# Altium footprint library MYLIB.PcbLib: 600 footprints (part 38 of 39)
Each footprint in its own frame and in the unit in brackets; x right, y up, seen from the top. Pads: shape width x height; smd on the part's side, far side on the other; paste and mask are expansions set on the pad; w line width, h text height; cw(c..) or ccw(c..) is an arc to the next point about the centre after c.
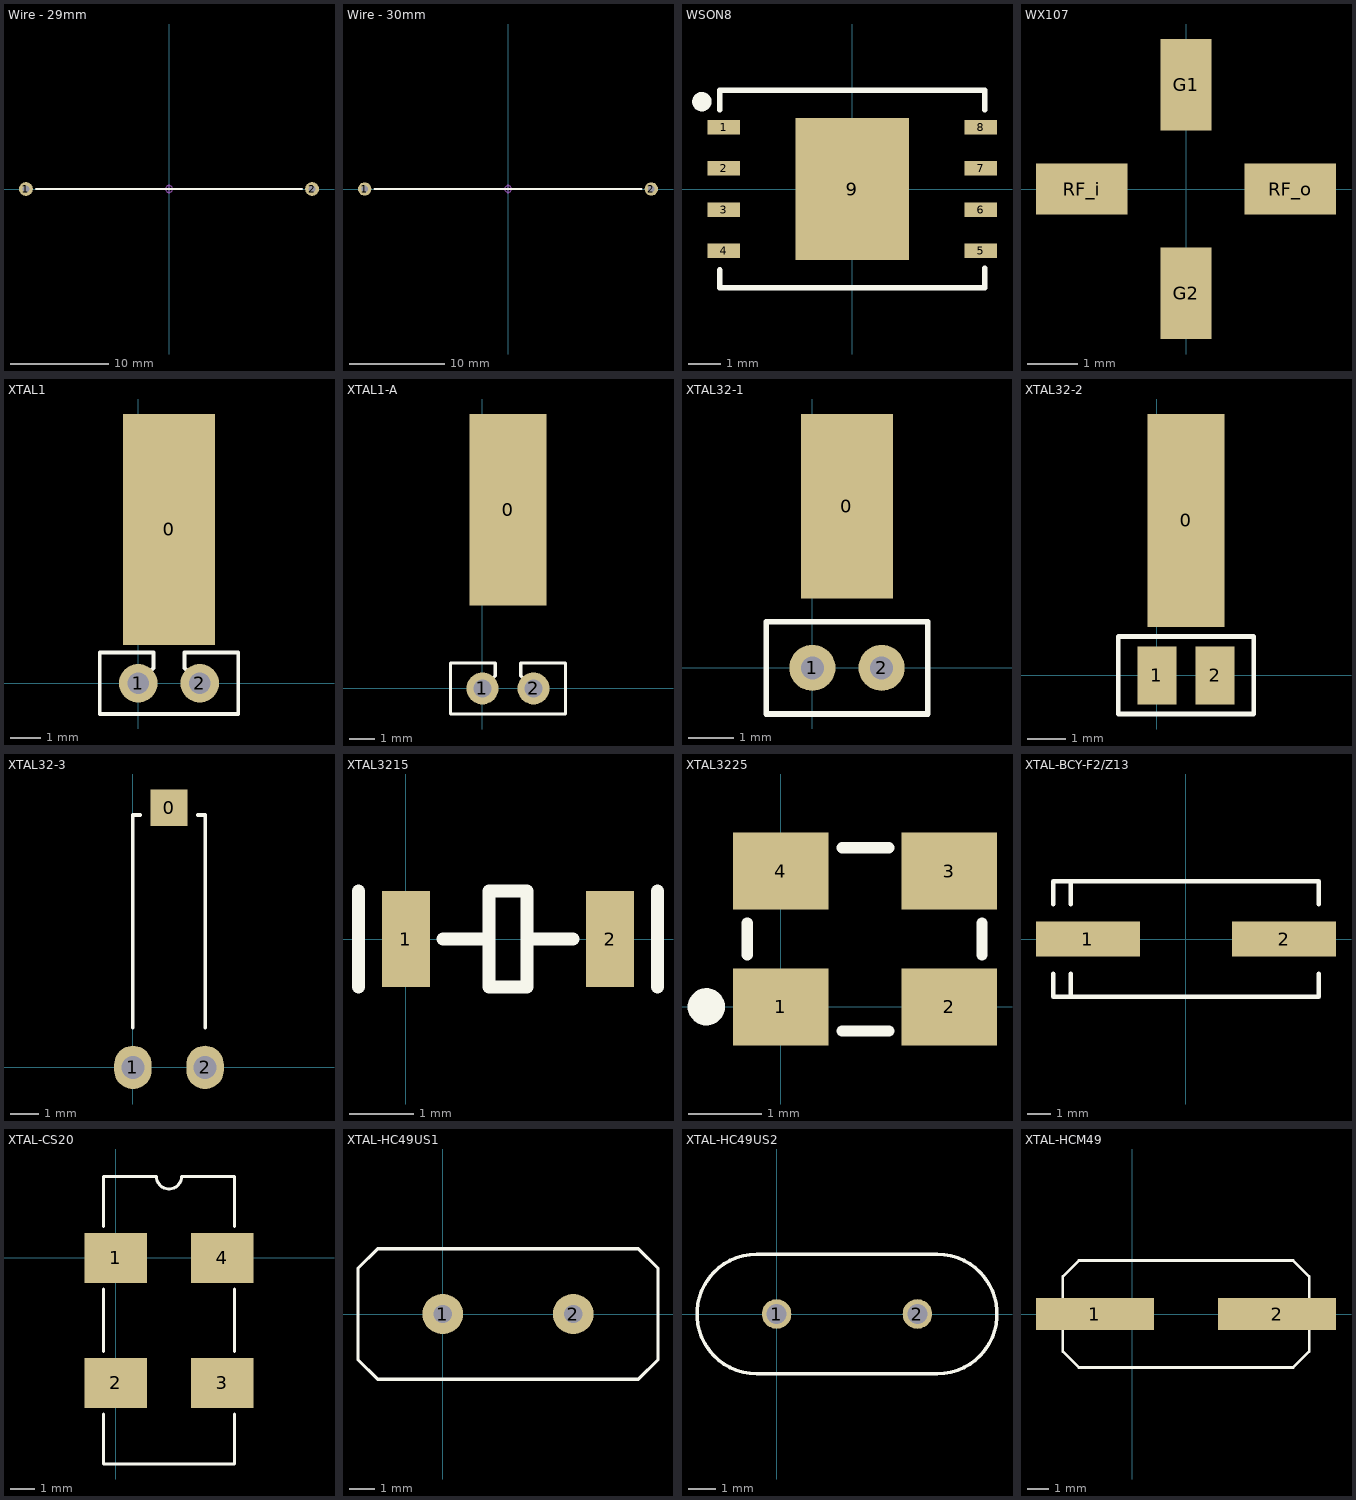
[diagram p37: the footprints below, top view; thin cyan lines are the x and y axes]

## Wire - 29mm [mm] "直接：0.5mm，脚距：29mm"
pads (2):
  round 1.4 hole 0.7: 1(-14.5,0) 2(14.5,0)
Top Overlay:
  lines w0.2: -13.5,0 13.5,0
Mechanical 15:
  circle w0.05: c0,0 r0.35
  lines w0.05: -0.5,0 0.5,0 ; 0,-0.5 0,0.5
3D body "Wire - 29mm.STEP": height 0.95, standoff -2.8, extent -14.75,-0.25 14.75,0.25

## Wire - 30mm [mm] "直接：0.5mm，脚距：30mm"
pads (2):
  round 1.4 hole 0.7: 1(-15,0) 2(15,0)
Top Overlay:
  lines w0.2: -14,0 14,0
Mechanical 15:
  circle w0.05: c0,0 r0.35
  lines w0.05: -0.5,0 0.5,0 ; 0,-0.5 0,0.5
3D body "Wire - 30mm.STEP": height 0.95, standoff -2.8, extent -15.25,-0.25 15.25,0.25

## WSON8 [mm]
pads (9):
  rect 1x0.45 smd: 1(-3.975,1.905) 2(-3.975,0.635) 3(-3.975,-0.635) 4(-3.975,-1.905) 5(3.975,-1.905) 6(3.975,-0.635) 7(3.975,0.635) 8(3.975,1.905)
  rect 3.5x4.4 smd: 9(0,0)
Top Overlay:
  circle w0.3: c-4.65,2.7 r0.15
  lines w0.178: -4.1,-2.504 -4.1,-3.05 4.1,-3.05 4.1,-2.449 ; -4.1,2.449 -4.1,3.05 4.1,3.05 ; 4.1,2.449 4.1,3.048
Mechanical 15:
  lines w0.1: -0.5,0 0.5,0 ; 0,-0.5 0,0.5

## WX107 [mil]
height 39.37
pads (4):
  rect 40x72 smd: G1(0,82) G2(0,-82)
  rect 72x40 smd: RF_i(-82,0) RF_o(82,0)

## XTAL1 [mil]
pads (3):
  rect 120x300 smd: 0(40,200)
  round 50 hole 28: 1(0,0) 2(80,0)
Top Overlay:
  lines w5: 0,0 20,20 20,40 -50,40 -50,0 -50,-40 130,-40 130,40 60,40 60,20 80,0

## XTAL1-A [mil]
pads (3):
  rect 120x300 smd: 0(40,280)
  round 50 hole 28: 1(0,0) 2(80,0)
Top Overlay:
  lines w5: 0,0 20,20 20,40 -50,40 -50,0 -50,-40 130,-40 130,40 60,40 60,20 80,0

## XTAL32-1 [mil]
pads (3):
  rect 80x160 smd: 0(30,140)
  round 40 hole 20: 1(0,0) 2(60,0)
Top Overlay:
  lines w5: -40,-40 100,-40 100,40 -40,40 -40,-40

## XTAL32-2 [mil]
pads (3):
  rect 80x220 smd: 0(30,160)
  rect 40x60 smd: 1(0,0) 2(60,0)
Top Overlay:
  lines w5: -40,-40 -40,40 100,40 100,-40 -40,-40

## XTAL32-3 [mil]
pads (3):
  rect 52x50 smd: 0(50,360)
  oval 52x60 hole 32: 1(0,0) 2(100,0)
Top Overlay:
  lines w5: 0,55 0,350 10,350 ; 90,350 100,350 100,55

## XTAL3215 [mm]
pads (2):
  rect 0.75x1.5 smd: 1(0,0) 2(3.2,0)
Top Overlay:
  lines w0.203: -0.742,-0.75 -0.742,0.75 ; 0.578,0 1.3,0 ; 2,0 2.617,0 ; 3.942,-0.75 3.942,0.75 ; 1.3,-0.75 1.9,-0.75 1.9,0.75 1.3,0.75 1.3,-0.75

## XTAL3225 [mm]
pads (4):
  rect 1.3x1.05 smd: 1(0,0) 2(2.3,0) 3(2.3,1.85) 4(0,1.85)
Top Overlay:
  circle w0.254: c-1.016,0 r0.127
  lines w0.152: -0.457,0.711 -0.457,1.143 ; 0.838,-0.33 1.473,-0.33 ; 0.838,2.17 1.473,2.17 ; 2.743,0.711 2.743,1.143

## XTAL-BCY-F2/Z13 [mm] "Quartz Crystal, SM; 2 Leads; Body 11.4 x 4.8 x 5 mm (LxWxH)"
height 5
pads (2):
  rect 4.5x1.5 smd: 1(-4.25,0) 2(4.25,0)
Top Overlay:
  lines w0.2: -5.75,-1.5 -5.75,-2.5 5.75,-2.5 5.75,-1.5 ; -5.75,1.5 -5.75,2.5 5.75,2.5 5.75,1.5 ; -5,-2.5 -5,-1.5 ; -5,1.5 -5,2.5

## XTAL-CS20 [mil]
pads (4):
  rect 100x80 smd: 1(0,0) 2(0,-200) 3(170,-200) 4(170,0)
Top Overlay:
  lines w5: -20,-250 -20,-330 190,-330 190,-250 ; -20,-150 -20,-50 ; -20,50 -20,130 65,130 ccw(c85,130) 105,130 190,130 190,50 ; 190,-150 190,-50

## XTAL-HC49US1 [mil]
pads (2):
  round 62 hole 28: 1(0,0) 2(200,0)
Top Overlay:
  lines w5: -130,-70 -100,-100 300,-100 330,-70 330,70 300,100 -100,100 -130,70 -130,-70

## XTAL-HC49US2 [mil]
pads (2):
  round 42 / inner round 68 / far side round 68 hole 28: 1(0,0) 2(200,0)
Top Overlay:
  lines w5: -28,-85.01 cw(c-28,0) -28,85.01 228,85.01 cw(c228,0) 228,-85.01 -28,-85.01

## XTAL-HCM49 [mil]
pads (2):
  rect 220x60 smd: 1(-70,0) 2(270,0)
Top Overlay:
  lines w5: -130,-70 -100,-100 300,-100 330,-70 330,70 300,100 -100,100 -130,70 -130,-70
3D body: height 0, standoff 0, extent -184,-102.5 384,102.5
3D body: height 0, standoff 0, extent -130.02,-70.02 -130.01,-70.01